# Altium integrated library Samtec_2,54_mm_Pitch_Socket_Strips.IntLib: 489 symbols (part 1 of 4) (continued)
## HLE-113-02-L-DV
designator J?
Cost-Effective Reliable Socket, Surface Mount, Vertical, -55 to 125 degC, 2.54 mm Pitch, 26-Pin, Female, RoHS; Manufacturer: Samtec; PartNumber: HLE-113-02-L-DV; Pitch: 2.54 mm; DatasheetVersion: F-214; PackageVersion: AQ, 12/1998; PackageReference: HLE-113-02-X-DV; PackageDescription: .100 Tiger Beam Socket Assembly; Supplier 1: Newark; Supplier Part Number 1: 84T4125; Orientation: Vertical; RoHS: True; Temperature Range: -55 to 125 degC; Mounting Technology: Surface Mount; ComponentLink1Description: Manufacturer URL; ComponentLink1URL: http://www.samtec.com; ComponentLink2Description: Datasheet; ComponentLink2URL: http://www.samtec.com/documents/webfiles/pdf/HLE.PDF; ComponentLink3Description: Package Specification; ComponentLink3URL: http://www.samtec.com/documents/webfiles/cpdf/HLE-1XX-02-XXX-DV-XX-XX-XX-MKT.pdf
footprint SMTC-HLE-113-02-X-DV (Tiger Beam Socket Assembly, 2x13 Pins, Vertical, 2.54mm Pitch, Female)
pins: 1, 2, 3, 4, 5, 6, 7, 8, 9, 10, 11, 12, 13, 14, 15, 16, 17, 18, 19, 20, 21, 22, 23, 24, 25, 26

## HLE-116-02-F-DV
designator J?
Cost-Effective Reliable Socket, Surface Mount, Vertical, -55 to 125 degC, 2.54 mm Pitch, 32-Pin, Female, RoHS; Manufacturer: Samtec; PartNumber: HLE-116-02-F-DV; Pitch: 2.54 mm; DatasheetVersion: F-214; PackageVersion: AQ, 12/1998; PackageReference: HLE-116-02-X-DV; PackageDescription: .100 Tiger Beam Socket Assembly; Orientation: Vertical; RoHS: True; Temperature Range: -55 to 125 degC; Mounting Technology: Surface Mount; ComponentLink1Description: Manufacturer URL; ComponentLink1URL: http://www.samtec.com; ComponentLink2Description: Datasheet; ComponentLink2URL: http://www.samtec.com/documents/webfiles/pdf/HLE.PDF; ComponentLink3Description: Package Specification; ComponentLink3URL: http://www.samtec.com/documents/webfiles/cpdf/HLE-1XX-02-XXX-DV-XX-XX-XX-MKT.pdf
footprint SMTC-HLE-116-02-X-DV (Tiger Beam Socket Assembly, 2x16 Pins, Vertical, 2.54mm Pitch, Female)
pins: 1, 2, 3, 4, 5, 6, 7, 8, 9, 10, 11, 12, 13, 14, 15, 16, 17, 18, 19, 20, 21, 22, 23, 24, 25, 26, 27, 28, 29, 30, 31, 32

## HLE-116-02-F-DV-A-K
designator J?
Cost-Effective Reliable Socket, Surface Mount, Vertical, -55 to 125 degC, 2.54 mm Pitch, 32-Pin, Female, RoHS; Manufacturer: Samtec; PartNumber: HLE-116-02-F-DV-A-K; Pitch: 2.54 mm; DatasheetVersion: F-214; PackageVersion: AQ, 12/1998; PackageReference: HLE-116-02-X-DV-A-K; PackageDescription: .100 Tiger Beam Socket Assembly; Orientation: Vertical; RoHS: True; Temperature Range: -55 to 125 degC; Mounting Technology: Surface Mount; ComponentLink1Description: Manufacturer URL; ComponentLink1URL: http://www.samtec.com; ComponentLink2Description: Datasheet; ComponentLink2URL: http://www.samtec.com/documents/webfiles/pdf/HLE.PDF; ComponentLink3Description: Package Specification; ComponentLink3URL: http://www.samtec.com/documents/webfiles/cpdf/HLE-1XX-02-XXX-DV-XX-XX-XX-MKT.pdf
footprint SMTC-HLE-116-02-X-DV-A-K (Tiger Beam Socket Assembly, 2x16 Pins, Vertical, 2.54mm Pitch, Female)
pins: 1, 2, 3, 4, 5, 6, 7, 8, 9, 10, 11, 12, 13, 14, 15, 16, 17, 18, 19, 20, 21, 22, 23, 24, 25, 26, 27, 28, 29, 30, 31, 32

## HLE-116-02-L-DV
designator J?
Cost-Effective Reliable Socket, Surface Mount, Vertical, -55 to 125 degC, 2.54 mm Pitch, 32-Pin, Female, RoHS; Manufacturer: Samtec; PartNumber: HLE-116-02-L-DV; Pitch: 2.54 mm; DatasheetVersion: F-214; PackageVersion: AQ, 12/1998; PackageReference: HLE-116-02-X-DV; PackageDescription: .100 Tiger Beam Socket Assembly; Supplier 1: Newark; Supplier Part Number 1: 84T4134; Orientation: Vertical; RoHS: True; Temperature Range: -55 to 125 degC; Mounting Technology: Surface Mount; ComponentLink1Description: Manufacturer URL; ComponentLink1URL: http://www.samtec.com; ComponentLink2Description: Datasheet; ComponentLink2URL: http://www.samtec.com/documents/webfiles/pdf/HLE.PDF; ComponentLink3Description: Package Specification; ComponentLink3URL: http://www.samtec.com/documents/webfiles/cpdf/HLE-1XX-02-XXX-DV-XX-XX-XX-MKT.pdf
footprint SMTC-HLE-116-02-X-DV (Tiger Beam Socket Assembly, 2x16 Pins, Vertical, 2.54mm Pitch, Female)
pins: 1, 2, 3, 4, 5, 6, 7, 8, 9, 10, 11, 12, 13, 14, 15, 16, 17, 18, 19, 20, 21, 22, 23, 24, 25, 26, 27, 28, 29, 30, 31, 32

## HLE-116-02-L-DV-A-K
designator J?
Cost-Effective Reliable Socket, Surface Mount, Vertical, -55 to 125 degC, 2.54 mm Pitch, 32-Pin, Female, RoHS; Manufacturer: Samtec; PartNumber: HLE-116-02-L-DV-A-K; Pitch: 2.54 mm; DatasheetVersion: F-214; PackageVersion: AQ, 12/1998; PackageReference: HLE-116-02-X-DV-A-K; PackageDescription: .100 Tiger Beam Socket Assembly; Orientation: Vertical; RoHS: True; Temperature Range: -55 to 125 degC; Mounting Technology: Surface Mount; ComponentLink1Description: Manufacturer URL; ComponentLink1URL: http://www.samtec.com; ComponentLink2Description: Datasheet; ComponentLink2URL: http://www.samtec.com/documents/webfiles/pdf/HLE.PDF; ComponentLink3Description: Package Specification; ComponentLink3URL: http://www.samtec.com/documents/webfiles/cpdf/HLE-1XX-02-XXX-DV-XX-XX-XX-MKT.pdf
footprint SMTC-HLE-116-02-X-DV-A-K (Tiger Beam Socket Assembly, 2x16 Pins, Vertical, 2.54mm Pitch, Female)
pins: 1, 2, 3, 4, 5, 6, 7, 8, 9, 10, 11, 12, 13, 14, 15, 16, 17, 18, 19, 20, 21, 22, 23, 24, 25, 26, 27, 28, 29, 30, 31, 32

## HLE-120-02-F-DV-BE
designator J?
Cost-Effective Reliable Socket, Surface Mount, Vertical, -55 to 125 degC, 2.54 mm Pitch, 40-Pin, Female, RoHS; Manufacturer: Samtec; PartNumber: HLE-120-02-F-DV-BE; Pitch: 2.54 mm; DatasheetVersion: F-214; PackageVersion: AQ, 12/1998; PackageReference: HLE-120-02-X-DV-BE; PackageDescription: .100 Tiger Beam Socket Assembly; Orientation: Vertical; RoHS: True; Temperature Range: -55 to 125 degC; Mounting Technology: Surface Mount; ComponentLink1Description: Manufacturer URL; ComponentLink1URL: http://www.samtec.com; ComponentLink2Description: Datasheet; ComponentLink2URL: http://www.samtec.com/documents/webfiles/pdf/HLE.PDF; ComponentLink3Description: Package Specification; ComponentLink3URL: http://www.samtec.com/documents/webfiles/cpdf/HLE-1XX-02-XXX-DV-XX-XX-XX-MKT.pdf
footprint SMTC-HLE-120-02-X-DV-BE (Tiger Beam Socket Assembly, 2x20 Pins, Vertical, 2.54mm Pitch, Female)
pins: 1, 2, 3, 4, 5, 6, 7, 8, 9, 10, 11, 12, 13, 14, 15, 16, 17, 18, 19, 20, 21, 22, 23, 24, 25, 26, 27, 28, 29, 30, 31, 32, 33, 34, 35, 36, 37, 38, 39, 40

## HLE-120-02-L-DV-BE
designator J?
Cost-Effective Reliable Socket, Surface Mount, Vertical, -55 to 125 degC, 2.54 mm Pitch, 40-Pin, Female, RoHS; Manufacturer: Samtec; PartNumber: HLE-120-02-L-DV-BE; Pitch: 2.54 mm; DatasheetVersion: F-214; PackageVersion: AQ, 12/1998; PackageReference: HLE-120-02-X-DV-BE; PackageDescription: .100 Tiger Beam Socket Assembly; Orientation: Vertical; RoHS: True; Temperature Range: -55 to 125 degC; Mounting Technology: Surface Mount; ComponentLink1Description: Manufacturer URL; ComponentLink1URL: http://www.samtec.com; ComponentLink2Description: Datasheet; ComponentLink2URL: http://www.samtec.com/documents/webfiles/pdf/HLE.PDF; ComponentLink3Description: Package Specification; ComponentLink3URL: http://www.samtec.com/documents/webfiles/cpdf/HLE-1XX-02-XXX-DV-XX-XX-XX-MKT.pdf
footprint SMTC-HLE-120-02-X-DV-BE (Tiger Beam Socket Assembly, 2x20 Pins, Vertical, 2.54mm Pitch, Female)
pins: 1, 2, 3, 4, 5, 6, 7, 8, 9, 10, 11, 12, 13, 14, 15, 16, 17, 18, 19, 20, 21, 22, 23, 24, 25, 26, 27, 28, 29, 30, 31, 32, 33, 34, 35, 36, 37, 38, 39, 40

## HLE-148-02-F-DV-A-P
designator J?
Cost-Effective Reliable Socket, Surface Mount, Vertical, -55 to 125 degC, 2.54 mm Pitch, 96-Pin, Female, RoHS; Manufacturer: Samtec; PartNumber: HLE-148-02-F-DV-A-P; Pitch: 2.54 mm; DatasheetVersion: F-214; PackageVersion: AQ, 12/1998; PackageReference: HLE-148-02-X-DV-A-P; PackageDescription: .100 Tiger Beam Socket Assembly; Orientation: Vertical; RoHS: True; Temperature Range: -55 to 125 degC; Mounting Technology: Surface Mount; ComponentLink1Description: Manufacturer URL; ComponentLink1URL: http://www.samtec.com; ComponentLink2Description: Datasheet; ComponentLink2URL: http://www.samtec.com/documents/webfiles/pdf/HLE.PDF; ComponentLink3Description: Package Specification; ComponentLink3URL: http://www.samtec.com/documents/webfiles/cpdf/HLE-1XX-02-XXX-DV-XX-XX-XX-MKT.pdf
footprint SMTC-HLE-148-02-X-DV-A-P (Tiger Beam Socket Assembly, 2x48 Pins, Vertical, 2.54mm Pitch, Female)
pins: 1, 2, 3, 4, 5, 6, 7, 8, 9, 10, 11, 12, 13, 14, 15, 16, 17, 18, 19, 20, 21, 22, 23, 24, 25, 26, 27, 28, 29, 30, 31, 32, 33, 34, 35, 36, 37, 38, 39, 40, 41, 42, 43, 44, 45, 46, 47, 48, 49, 50, 51, 52, 53, 54, 55, 56, 57, 58, 59, 60, 61, 62, 63, 64, 65, 66, 67, 68, 69, 70, 71, 72, 73, 74, 75, 76, 77, 78, 79, 80, 81, 82, 83, 84, 85, 86, 87, 88, 89, 90, 91, 92, 93, 94, 95, 96

## HLE-148-02-L-DV-A-P
designator J?
Cost-Effective Reliable Socket, Surface Mount, Vertical, -55 to 125 degC, 2.54 mm Pitch, 96-Pin, Female, RoHS; Manufacturer: Samtec; PartNumber: HLE-148-02-L-DV-A-P; Pitch: 2.54 mm; DatasheetVersion: F-214; PackageVersion: AQ, 12/1998; PackageReference: HLE-148-02-X-DV-A-P; PackageDescription: .100 Tiger Beam Socket Assembly; Orientation: Vertical; RoHS: True; Temperature Range: -55 to 125 degC; Mounting Technology: Surface Mount; ComponentLink1Description: Manufacturer URL; ComponentLink1URL: http://www.samtec.com; ComponentLink2Description: Datasheet; ComponentLink2URL: http://www.samtec.com/documents/webfiles/pdf/HLE.PDF; ComponentLink3Description: Package Specification; ComponentLink3URL: http://www.samtec.com/documents/webfiles/cpdf/HLE-1XX-02-XXX-DV-XX-XX-XX-MKT.pdf
footprint SMTC-HLE-148-02-X-DV-A-P (Tiger Beam Socket Assembly, 2x48 Pins, Vertical, 2.54mm Pitch, Female)
pins: 1, 2, 3, 4, 5, 6, 7, 8, 9, 10, 11, 12, 13, 14, 15, 16, 17, 18, 19, 20, 21, 22, 23, 24, 25, 26, 27, 28, 29, 30, 31, 32, 33, 34, 35, 36, 37, 38, 39, 40, 41, 42, 43, 44, 45, 46, 47, 48, 49, 50, 51, 52, 53, 54, 55, 56, 57, 58, 59, 60, 61, 62, 63, 64, 65, 66, 67, 68, 69, 70, 71, 72, 73, 74, 75, 76, 77, 78, 79, 80, 81, 82, 83, 84, 85, 86, 87, 88, 89, 90, 91, 92, 93, 94, 95, 96

## PHF-102-01-L-S-002
designator J?
Press Fit Socket, Through-hole, Vertical, -55 to 125 degC, 2.54 mm Pitch, 2-Pin, Female, RoHS; Manufacturer: Samtec; PartNumber: PHF-102-01-L-S-002; Pitch: 2.54 mm; DatasheetVersion: F-214; PackageVersion: F, 9/2009; PackageReference: PHF-102-01-X-S-002; PackageDescription: .100 Press Fit Socket Assembly; Orientation: Vertical; RoHS: True; Temperature Range: -55 to 125 degC; Mounting Technology: Through-hole; ComponentLink1Description: Manufacturer URL; ComponentLink1URL: http://www.samtec.com; ComponentLink2Description: Datasheet; ComponentLink2URL: http://www.samtec.com/documents/webfiles/pdf/phf.pdf; ComponentLink3Description: Package Specification; ComponentLink3URL: http://www.samtec.com/documents/webfiles/cpdf/PHF-1XX-XX-X-X-XXX-MKT.pdf
footprint SMTC-PHF-102-01-X-S-002 (Press Fit Socket Assembly, 1x2 Pins, Vertical, 2.54mm Pitch, Female)
pins: 1, 2

## PHF-102-01-L-S-02
designator J?
Press Fit Socket, Through-hole, Vertical, -55 to 125 degC, 2.54 mm Pitch, 2-Pin, Female, RoHS; Manufacturer: Samtec; PartNumber: PHF-102-01-L-S-02; Pitch: 2.54 mm; DatasheetVersion: F-214; PackageVersion: F, 9/2009; PackageReference: PHF-102-01-X-S-02; PackageDescription: .100 Press Fit Socket Assembly; Orientation: Vertical; RoHS: True; Temperature Range: -55 to 125 degC; Mounting Technology: Through-hole; ComponentLink1Description: Manufacturer URL; ComponentLink1URL: http://www.samtec.com; ComponentLink2Description: Datasheet; ComponentLink2URL: http://www.samtec.com/documents/webfiles/pdf/phf.pdf; ComponentLink3Description: Package Specification; ComponentLink3URL: http://www.samtec.com/documents/webfiles/cpdf/PHF-1XX-XX-X-X-XXX-MKT.pdf
footprint SMTC-PHF-102-01-X-S-02 (Press Fit Socket Assembly, 1x2 Pins, Vertical, 2.54mm Pitch, Female)
pins: 1, 2

## PHF-102-03-L-S
designator J?
Press Fit Socket, Through-hole, Vertical, -55 to 125 degC, 2.54 mm Pitch, 2-Pin, Female, RoHS; Manufacturer: Samtec; PartNumber: PHF-102-03-L-S; Pitch: 2.54 mm; DatasheetVersion: F-214; PackageVersion: F, 9/2009; PackageReference: PHF-102-03-X-S; PackageDescription: .100 Press Fit Socket Assembly; Orientation: Vertical; RoHS: True; Temperature Range: -55 to 125 degC; Mounting Technology: Through-hole; ComponentLink1Description: Manufacturer URL; ComponentLink1URL: http://www.samtec.com; ComponentLink2Description: Datasheet; ComponentLink2URL: http://www.samtec.com/documents/webfiles/pdf/phf.pdf; ComponentLink3Description: Package Specification; ComponentLink3URL: http://www.samtec.com/documents/webfiles/cpdf/PHF-1XX-XX-X-X-XXX-MKT.pdf
footprint SMTC-PHF-102-03-X-S (Press Fit Socket Assembly, 1x2 Pins, Vertical, 2.54mm Pitch, Female)
pins: 1, 2

## PHF-102-04-L-S
designator J?
Press Fit Socket, Through-hole, Vertical, -55 to 125 degC, 2.54 mm Pitch, 2-Pin, Female, RoHS; Manufacturer: Samtec; PartNumber: PHF-102-04-L-S; Pitch: 2.54 mm; DatasheetVersion: F-214; PackageVersion: F, 9/2009; PackageReference: PHF-102-04-X-S; PackageDescription: .100 Press Fit Socket Assembly; Orientation: Vertical; RoHS: True; Temperature Range: -55 to 125 degC; Mounting Technology: Through-hole; ComponentLink1Description: Manufacturer URL; ComponentLink1URL: http://www.samtec.com; ComponentLink2Description: Datasheet; ComponentLink2URL: http://www.samtec.com/documents/webfiles/pdf/phf.pdf; ComponentLink3Description: Package Specification; ComponentLink3URL: http://www.samtec.com/documents/webfiles/cpdf/PHF-1XX-XX-X-X-XXX-MKT.pdf
footprint SMTC-PHF-102-04-X-S (Press Fit Socket Assembly, 1x2 Pins, Vertical, 2.54mm Pitch, Female)
pins: 1, 2

## PHF-103-01-L-S-001
designator J?
Press Fit Socket, Through-hole, Vertical, -55 to 125 degC, 2.54 mm Pitch, 3-Pin, Female, RoHS; Manufacturer: Samtec; PartNumber: PHF-103-01-L-S-001; Pitch: 2.54 mm; DatasheetVersion: F-214; PackageVersion: F, 9/2009; PackageReference: PHF-103-01-X-S-001; PackageDescription: .100 Press Fit Socket Assembly; Orientation: Vertical; RoHS: True; Temperature Range: -55 to 125 degC; Mounting Technology: Through-hole; ComponentLink1Description: Manufacturer URL; ComponentLink1URL: http://www.samtec.com; ComponentLink2Description: Datasheet; ComponentLink2URL: http://www.samtec.com/documents/webfiles/pdf/phf.pdf; ComponentLink3Description: Package Specification; ComponentLink3URL: http://www.samtec.com/documents/webfiles/cpdf/PHF-1XX-XX-X-X-XXX-MKT.pdf
footprint SMTC-PHF-103-01-X-S-001 (Press Fit Socket Assembly, 1x3 Pins, Vertical, 2.54mm Pitch, Female)
pins: 1, 2, 3

## PHF-103-01-L-S-002
designator J?
Press Fit Socket, Through-hole, Vertical, -55 to 125 degC, 2.54 mm Pitch, 3-Pin, Female, RoHS; Manufacturer: Samtec; PartNumber: PHF-103-01-L-S-002; Pitch: 2.54 mm; DatasheetVersion: F-214; PackageVersion: F, 9/2009; PackageReference: PHF-103-01-X-S-002; PackageDescription: .100 Press Fit Socket Assembly; Orientation: Vertical; RoHS: True; Temperature Range: -55 to 125 degC; Mounting Technology: Through-hole; ComponentLink1Description: Manufacturer URL; ComponentLink1URL: http://www.samtec.com; ComponentLink2Description: Datasheet; ComponentLink2URL: http://www.samtec.com/documents/webfiles/pdf/phf.pdf; ComponentLink3Description: Package Specification; ComponentLink3URL: http://www.samtec.com/documents/webfiles/cpdf/PHF-1XX-XX-X-X-XXX-MKT.pdf
footprint SMTC-PHF-103-01-X-S-002 (Press Fit Socket Assembly, 1x3 Pins, Vertical, 2.54mm Pitch, Female)
pins: 1, 2, 3

## PHF-105-01-L-D
designator J?
Press Fit Socket, Through-hole, Vertical, -55 to 125 degC, 2.54 mm Pitch, 10-Pin, Female, RoHS; Manufacturer: Samtec; PartNumber: PHF-105-01-L-D; Pitch: 2.54 mm; DatasheetVersion: F-214; PackageVersion: F, 9/2009; PackageReference: PHF-105-01-X-D; PackageDescription: .100 Press Fit Socket Assembly; Orientation: Vertical; RoHS: True; Temperature Range: -55 to 125 degC; Mounting Technology: Through-hole; ComponentLink1Description: Manufacturer URL; ComponentLink1URL: http://www.samtec.com; ComponentLink2Description: Datasheet; ComponentLink2URL: http://www.samtec.com/documents/webfiles/pdf/phf.pdf; ComponentLink3Description: Package Specification; ComponentLink3URL: http://www.samtec.com/documents/webfiles/cpdf/PHF-1XX-XX-X-X-XXX-MKT.pdf
footprint SMTC-PHF-105-01-X-D (Press Fit Socket Assembly, 2x5 Pins, Vertical, 2.54mm Pitch, Female)
pins: 1, 2, 3, 4, 5, 6, 7, 8, 9, 10

## PHF-105-01-L-S
designator J?
Press Fit Socket, Through-hole, Vertical, -55 to 125 degC, 2.54 mm Pitch, 5-Pin, Female, RoHS; Manufacturer: Samtec; PartNumber: PHF-105-01-L-S; Pitch: 2.54 mm; DatasheetVersion: F-214; PackageVersion: F, 9/2009; PackageReference: PHF-105-01-X-S; PackageDescription: .100 Press Fit Socket Assembly; Orientation: Vertical; RoHS: True; Temperature Range: -55 to 125 degC; Mounting Technology: Through-hole; ComponentLink1Description: Manufacturer URL; ComponentLink1URL: http://www.samtec.com; ComponentLink2Description: Datasheet; ComponentLink2URL: http://www.samtec.com/documents/webfiles/pdf/phf.pdf; ComponentLink3Description: Package Specification; ComponentLink3URL: http://www.samtec.com/documents/webfiles/cpdf/PHF-1XX-XX-X-X-XXX-MKT.pdf
footprint SMTC-PHF-105-01-X-S (Press Fit Socket Assembly, 1x5 Pins, Vertical, 2.54mm Pitch, Female)
pins: 1, 2, 3, 4, 5

## PHF-105-02-L-D
designator J?
Press Fit Socket, Through-hole, Vertical, -55 to 125 degC, 2.54 mm Pitch, 10-Pin, Female, RoHS; Manufacturer: Samtec; PartNumber: PHF-105-02-L-D; Pitch: 2.54 mm; DatasheetVersion: F-214; PackageVersion: F, 9/2009; PackageReference: PHF-105-02-X-D; PackageDescription: .100 Press Fit Socket Assembly; Orientation: Vertical; RoHS: True; Temperature Range: -55 to 125 degC; Mounting Technology: Through-hole; ComponentLink1Description: Manufacturer URL; ComponentLink1URL: http://www.samtec.com; ComponentLink2Description: Datasheet; ComponentLink2URL: http://www.samtec.com/documents/webfiles/pdf/phf.pdf; ComponentLink3Description: Package Specification; ComponentLink3URL: http://www.samtec.com/documents/webfiles/cpdf/PHF-1XX-XX-X-X-XXX-MKT.pdf
footprint SMTC-PHF-105-02-X-D (Press Fit Socket Assembly, 2x5 Pins, Vertical, 2.54mm Pitch, Female)
pins: 1, 2, 3, 4, 5, 6, 7, 8, 9, 10

## PHF-105-04-L-S
designator J?
Press Fit Socket, Through-hole, Vertical, -55 to 125 degC, 2.54 mm Pitch, 5-Pin, Female, RoHS; Manufacturer: Samtec; PartNumber: PHF-105-04-L-S; Pitch: 2.54 mm; DatasheetVersion: F-214; PackageVersion: F, 9/2009; PackageReference: PHF-105-04-X-S; PackageDescription: .100 Press Fit Socket Assembly; Supplier 1: Newark; Supplier Part Number 1: 28X4866; Orientation: Vertical; RoHS: True; Temperature Range: -55 to 125 degC; Mounting Technology: Through-hole; ComponentLink1Description: Manufacturer URL; ComponentLink1URL: http://www.samtec.com; ComponentLink2Description: Datasheet; ComponentLink2URL: http://www.samtec.com/documents/webfiles/pdf/phf.pdf; ComponentLink3Description: Package Specification; ComponentLink3URL: http://www.samtec.com/documents/webfiles/cpdf/PHF-1XX-XX-X-X-XXX-MKT.pdf
footprint SMTC-PHF-105-04-X-S (Press Fit Socket Assembly, 1x5 Pins, Vertical, 2.54mm Pitch, Female)
pins: 1, 2, 3, 4, 5

## PHF-108-01-L-D
designator J?
Press Fit Socket, Through-hole, Vertical, -55 to 125 degC, 2.54 mm Pitch, 16-Pin, Female, RoHS; Manufacturer: Samtec; PartNumber: PHF-108-01-L-D; Pitch: 2.54 mm; DatasheetVersion: F-214; PackageVersion: F, 9/2009; PackageReference: PHF-108-01-X-D; PackageDescription: .100 Press Fit Socket Assembly; Orientation: Vertical; RoHS: True; Temperature Range: -55 to 125 degC; Mounting Technology: Through-hole; ComponentLink1Description: Manufacturer URL; ComponentLink1URL: http://www.samtec.com; ComponentLink2Description: Datasheet; ComponentLink2URL: http://www.samtec.com/documents/webfiles/pdf/phf.pdf; ComponentLink3Description: Package Specification; ComponentLink3URL: http://www.samtec.com/documents/webfiles/cpdf/PHF-1XX-XX-X-X-XXX-MKT.pdf
footprint SMTC-PHF-108-01-X-D (Press Fit Socket Assembly, 2x8 Pins, Vertical, 2.54mm Pitch, Female)
pins: 1, 2, 3, 4, 5, 6, 7, 8, 9, 10, 11, 12, 13, 14, 15, 16

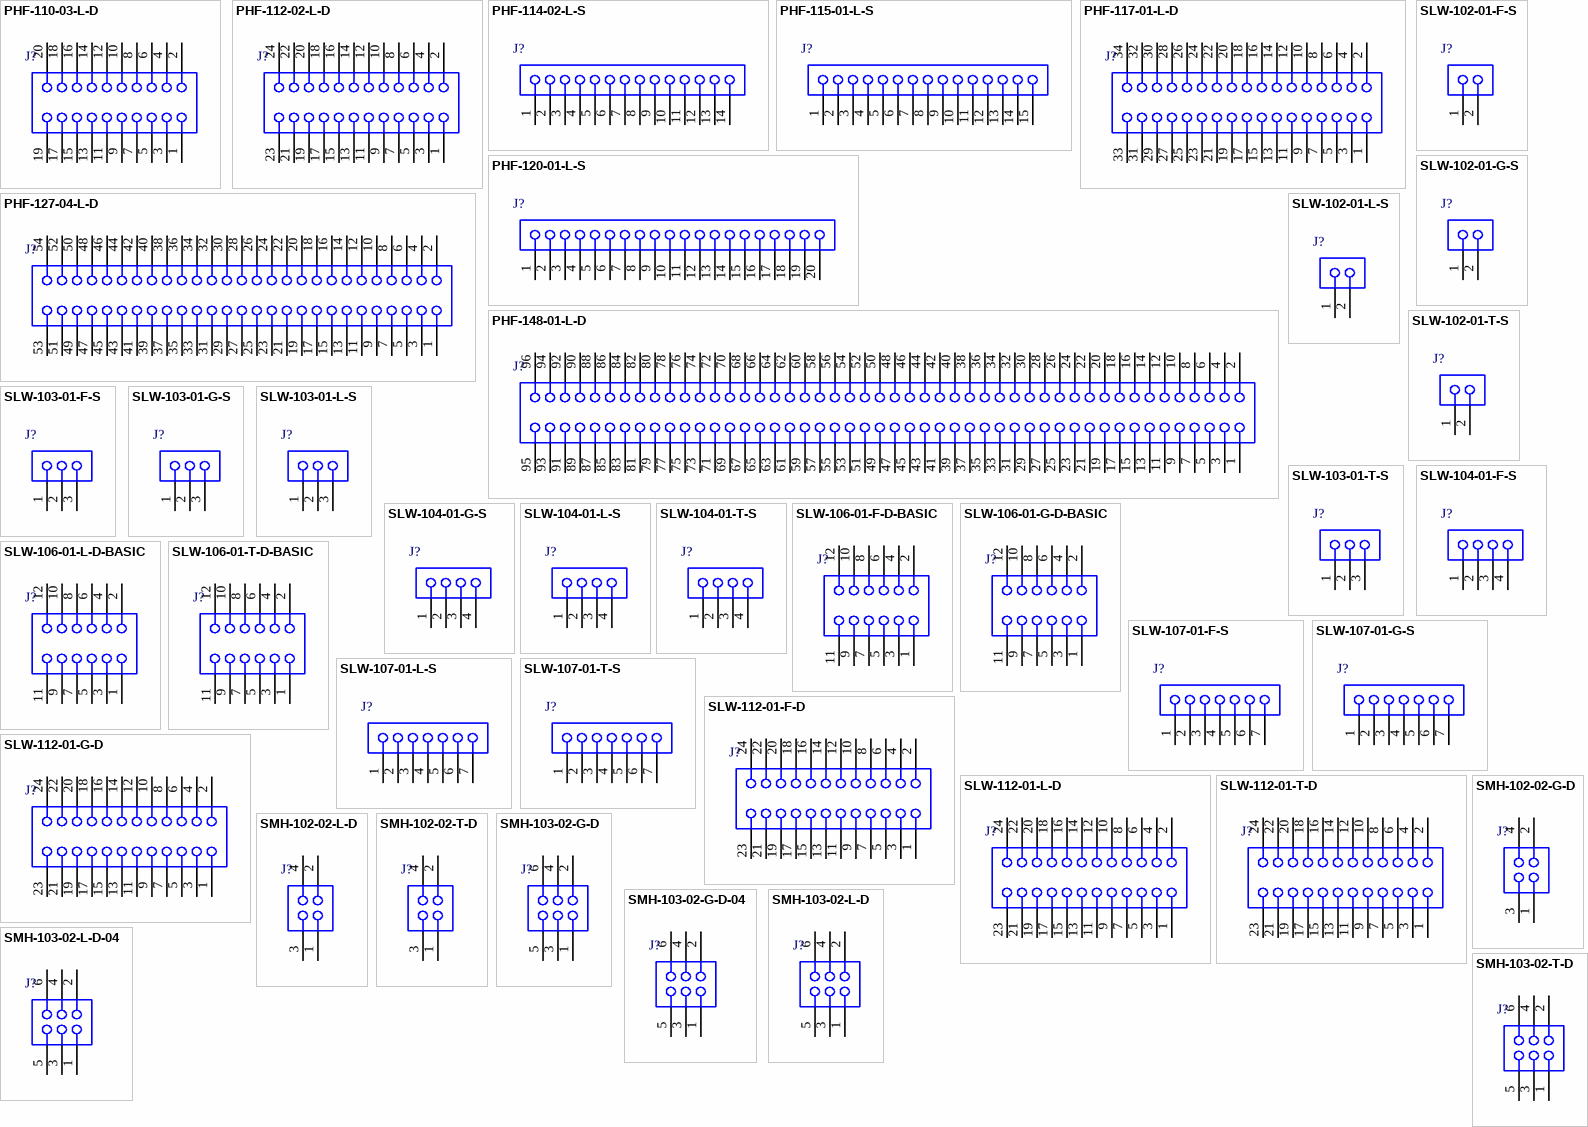
[diagram p3: symbols PHF-110-03-L-D to SMH-103-02-T-D]

## PHF-110-03-L-D
designator J?
Press Fit Socket, Through-hole, Vertical, -55 to 125 degC, 2.54 mm Pitch, 20-Pin, Female, RoHS; Manufacturer: Samtec; PartNumber: PHF-110-03-L-D; Pitch: 2.54 mm; DatasheetVersion: F-214; PackageVersion: F, 9/2009; PackageReference: PHF-110-03-X-D; PackageDescription: .100 Press Fit Socket Assembly; Orientation: Vertical; RoHS: True; Temperature Range: -55 to 125 degC; Mounting Technology: Through-hole; ComponentLink1Description: Manufacturer URL; ComponentLink1URL: http://www.samtec.com; ComponentLink2Description: Datasheet; ComponentLink2URL: http://www.samtec.com/documents/webfiles/pdf/phf.pdf; ComponentLink3Description: Package Specification; ComponentLink3URL: http://www.samtec.com/documents/webfiles/cpdf/PHF-1XX-XX-X-X-XXX-MKT.pdf
footprint SMTC-PHF-110-03-X-D (Press Fit Socket Assembly, 2x10 Pins, Vertical, 2.54mm Pitch, Female)
pins: 1, 2, 3, 4, 5, 6, 7, 8, 9, 10, 11, 12, 13, 14, 15, 16, 17, 18, 19, 20

## PHF-112-02-L-D
designator J?
Press Fit Socket, Through-hole, Vertical, -55 to 125 degC, 2.54 mm Pitch, 24-Pin, Female, RoHS; Manufacturer: Samtec; PartNumber: PHF-112-02-L-D; Pitch: 2.54 mm; DatasheetVersion: F-214; PackageVersion: F, 9/2009; PackageReference: PHF-112-02-X-D; PackageDescription: .100 Press Fit Socket Assembly; Orientation: Vertical; RoHS: True; Temperature Range: -55 to 125 degC; Mounting Technology: Through-hole; ComponentLink1Description: Manufacturer URL; ComponentLink1URL: http://www.samtec.com; ComponentLink2Description: Datasheet; ComponentLink2URL: http://www.samtec.com/documents/webfiles/pdf/phf.pdf; ComponentLink3Description: Package Specification; ComponentLink3URL: http://www.samtec.com/documents/webfiles/cpdf/PHF-1XX-XX-X-X-XXX-MKT.pdf
footprint SMTC-PHF-112-02-X-D (Press Fit Socket Assembly, 2x12 Pins, Vertical, 2.54mm Pitch, Female)
pins: 1, 2, 3, 4, 5, 6, 7, 8, 9, 10, 11, 12, 13, 14, 15, 16, 17, 18, 19, 20, 21, 22, 23, 24

## PHF-114-02-L-S
designator J?
Press Fit Socket, Through-hole, Vertical, -55 to 125 degC, 2.54 mm Pitch, 14-Pin, Female, RoHS; Manufacturer: Samtec; PartNumber: PHF-114-02-L-S; Pitch: 2.54 mm; DatasheetVersion: F-214; PackageVersion: F, 9/2009; PackageReference: PHF-114-02-X-S; PackageDescription: .100 Press Fit Socket Assembly; Orientation: Vertical; RoHS: True; Temperature Range: -55 to 125 degC; Mounting Technology: Through-hole; ComponentLink1Description: Manufacturer URL; ComponentLink1URL: http://www.samtec.com; ComponentLink2Description: Datasheet; ComponentLink2URL: http://www.samtec.com/documents/webfiles/pdf/phf.pdf; ComponentLink3Description: Package Specification; ComponentLink3URL: http://www.samtec.com/documents/webfiles/cpdf/PHF-1XX-XX-X-X-XXX-MKT.pdf
footprint SMTC-PHF-114-02-X-S (Press Fit Socket Assembly, 1x14 Pins, Vertical, 2.54mm Pitch, Female)
pins: 1, 2, 3, 4, 5, 6, 7, 8, 9, 10, 11, 12, 13, 14

## PHF-115-01-L-S
designator J?
Press Fit Socket, Through-hole, Vertical, -55 to 125 degC, 2.54 mm Pitch, 15-Pin, Female, RoHS; Manufacturer: Samtec; PartNumber: PHF-115-01-L-S; Pitch: 2.54 mm; DatasheetVersion: F-214; PackageVersion: F, 9/2009; PackageReference: PHF-115-01-X-S; PackageDescription: .100 Press Fit Socket Assembly; Orientation: Vertical; RoHS: True; Temperature Range: -55 to 125 degC; Mounting Technology: Through-hole; ComponentLink1Description: Manufacturer URL; ComponentLink1URL: http://www.samtec.com; ComponentLink2Description: Datasheet; ComponentLink2URL: http://www.samtec.com/documents/webfiles/pdf/phf.pdf; ComponentLink3Description: Package Specification; ComponentLink3URL: http://www.samtec.com/documents/webfiles/cpdf/PHF-1XX-XX-X-X-XXX-MKT.pdf
footprint SMTC-PHF-115-01-X-S (Press Fit Socket Assembly, 1x15 Pins, Vertical, 2.54mm Pitch, Female)
pins: 1, 2, 3, 4, 5, 6, 7, 8, 9, 10, 11, 12, 13, 14, 15

## PHF-117-01-L-D
designator J?
Press Fit Socket, Through-hole, Vertical, -55 to 125 degC, 2.54 mm Pitch, 34-Pin, Female, RoHS; Manufacturer: Samtec; PartNumber: PHF-117-01-L-D; Pitch: 2.54 mm; DatasheetVersion: F-214; PackageVersion: F, 9/2009; PackageReference: PHF-117-01-X-D; PackageDescription: .100 Press Fit Socket Assembly; Orientation: Vertical; RoHS: True; Temperature Range: -55 to 125 degC; Mounting Technology: Through-hole; ComponentLink1Description: Manufacturer URL; ComponentLink1URL: http://www.samtec.com; ComponentLink2Description: Datasheet; ComponentLink2URL: http://www.samtec.com/documents/webfiles/pdf/phf.pdf; ComponentLink3Description: Package Specification; ComponentLink3URL: http://www.samtec.com/documents/webfiles/cpdf/PHF-1XX-XX-X-X-XXX-MKT.pdf
footprint SMTC-PHF-117-01-X-D (Press Fit Socket Assembly, 2x17 Pins, Vertical, 2.54mm Pitch, Female)
pins: 1, 2, 3, 4, 5, 6, 7, 8, 9, 10, 11, 12, 13, 14, 15, 16, 17, 18, 19, 20, 21, 22, 23, 24, 25, 26, 27, 28, 29, 30, 31, 32, 33, 34

## PHF-120-01-L-S
designator J?
Press Fit Socket, Through-hole, Vertical, -55 to 125 degC, 2.54 mm Pitch, 20-Pin, Female, RoHS; Manufacturer: Samtec; PartNumber: PHF-120-01-L-S; Pitch: 2.54 mm; DatasheetVersion: F-214; PackageVersion: F, 9/2009; PackageReference: PHF-120-01-X-S; PackageDescription: .100 Press Fit Socket Assembly; Orientation: Vertical; RoHS: True; Temperature Range: -55 to 125 degC; Mounting Technology: Through-hole; ComponentLink1Description: Manufacturer URL; ComponentLink1URL: http://www.samtec.com; ComponentLink2Description: Datasheet; ComponentLink2URL: http://www.samtec.com/documents/webfiles/pdf/phf.pdf; ComponentLink3Description: Package Specification; ComponentLink3URL: http://www.samtec.com/documents/webfiles/cpdf/PHF-1XX-XX-X-X-XXX-MKT.pdf
footprint SMTC-PHF-120-01-X-S (Press Fit Socket Assembly, 1x20 Pins, Vertical, 2.54mm Pitch, Female)
pins: 1, 2, 3, 4, 5, 6, 7, 8, 9, 10, 11, 12, 13, 14, 15, 16, 17, 18, 19, 20

## PHF-127-04-L-D
designator J?
Press Fit Socket, Through-hole, Vertical, -55 to 125 degC, 2.54 mm Pitch, 54-Pin, Female, RoHS; Manufacturer: Samtec; PartNumber: PHF-127-04-L-D; Pitch: 2.54 mm; DatasheetVersion: F-214; PackageVersion: F, 9/2009; PackageReference: PHF-127-04-X-D; PackageDescription: .100 Press Fit Socket Assembly; Orientation: Vertical; RoHS: True; Temperature Range: -55 to 125 degC; Mounting Technology: Through-hole; ComponentLink1Description: Manufacturer URL; ComponentLink1URL: http://www.samtec.com; ComponentLink2Description: Datasheet; ComponentLink2URL: http://www.samtec.com/documents/webfiles/pdf/phf.pdf; ComponentLink3Description: Package Specification; ComponentLink3URL: http://www.samtec.com/documents/webfiles/cpdf/PHF-1XX-XX-X-X-XXX-MKT.pdf
footprint SMTC-PHF-127-04-X-D (Press Fit Socket Assembly, 2x27 Pins, Vertical, 2.54mm Pitch, Female)
pins: 1, 2, 3, 4, 5, 6, 7, 8, 9, 10, 11, 12, 13, 14, 15, 16, 17, 18, 19, 20, 21, 22, 23, 24, 25, 26, 27, 28, 29, 30, 31, 32, 33, 34, 35, 36, 37, 38, 39, 40, 41, 42, 43, 44, 45, 46, 47, 48, 49, 50, 51, 52, 53, 54

## PHF-148-01-L-D
designator J?
Press Fit Socket, Through-hole, Vertical, -55 to 125 degC, 2.54 mm Pitch, 96-Pin, Female, RoHS; Manufacturer: Samtec; PartNumber: PHF-148-01-L-D; Pitch: 2.54 mm; DatasheetVersion: F-214; PackageVersion: F, 9/2009; PackageReference: PHF-148-01-X-D; PackageDescription: .100 Press Fit Socket Assembly; Orientation: Vertical; RoHS: True; Temperature Range: -55 to 125 degC; Mounting Technology: Through-hole; ComponentLink1Description: Manufacturer URL; ComponentLink1URL: http://www.samtec.com; ComponentLink2Description: Datasheet; ComponentLink2URL: http://www.samtec.com/documents/webfiles/pdf/phf.pdf; ComponentLink3Description: Package Specification; ComponentLink3URL: http://www.samtec.com/documents/webfiles/cpdf/PHF-1XX-XX-X-X-XXX-MKT.pdf
footprint SMTC-PHF-148-01-X-D (Press Fit Socket Assembly, 2x48 Pins, Vertical, 2.54mm Pitch, Female)
pins: 1, 2, 3, 4, 5, 6, 7, 8, 9, 10, 11, 12, 13, 14, 15, 16, 17, 18, 19, 20, 21, 22, 23, 24, 25, 26, 27, 28, 29, 30, 31, 32, 33, 34, 35, 36, 37, 38, 39, 40, 41, 42, 43, 44, 45, 46, 47, 48, 49, 50, 51, 52, 53, 54, 55, 56, 57, 58, 59, 60, 61, 62, 63, 64, 65, 66, 67, 68, 69, 70, 71, 72, 73, 74, 75, 76, 77, 78, 79, 80, 81, 82, 83, 84, 85, 86, 87, 88, 89, 90, 91, 92, 93, 94, 95, 96

## SLW-102-01-F-S
designator J?
Low Profile Socket Strips, Through-hole, Vertical, -55 to 125 degC, 2.54 mm Pitch, 2-Pin, Female, RoHS; Manufacturer: Samtec; PartNumber: SLW-102-01-F-S; Pitch: 2.54 mm; DatasheetVersion: F-214; PackageVersion: X, 9/1987; PackageReference: SLW-102-01-X-S; PackageDescription: Low Profile Socket Strip; Orientation: Vertical; RoHS: True; Temperature Range: -55 to 125 degC; Mounting Technology: Through-hole; ComponentLink1Description: Manufacturer URL; ComponentLink1URL: http://www.samtec.com; ComponentLink2Description: Datasheet; ComponentLink2URL: http://www.samtec.com/documents/webfiles/pdf/SLW.PDF; ComponentLink3Description: Package Specification; ComponentLink3URL: http://www.samtec.com/documents/webfiles/cpdf/SLW-1XX-01-X-X-MKT.pdf
footprint SMTC-SLW-102-01-X-S (Low Profile Socket Strip, 1x2 Pins, Vertical, 2.54mm Pitch, Female)
pins: 1, 2

## SLW-102-01-G-S
designator J?
Low Profile Socket Strips, Through-hole, Vertical, -55 to 125 degC, 2.54 mm Pitch, 2-Pin, Female, RoHS; Manufacturer: Samtec; PartNumber: SLW-102-01-G-S; Pitch: 2.54 mm; DatasheetVersion: F-214; PackageVersion: X, 9/1987; PackageReference: SLW-102-01-X-S; PackageDescription: Low Profile Socket Strip; Supplier 1: Digi-Key; Supplier Part Number 1: SAM1089-02-ND; Supplier 2: Farnell; Supplier Part Number 2: 1668093; Supplier 3: Newark; Supplier Part Number 3: 11P6845; Orientation: Vertical; RoHS: True; Temperature Range: -55 to 125 degC; Mounting Technology: Through-hole; ComponentLink1Description: Manufacturer URL; ComponentLink1URL: http://www.samtec.com; ComponentLink2Description: Datasheet; ComponentLink2URL: http://www.samtec.com/documents/webfiles/pdf/SLW.PDF; ComponentLink3Description: Package Specification; ComponentLink3URL: http://www.samtec.com/documents/webfiles/cpdf/SLW-1XX-01-X-X-MKT.pdf
footprint SMTC-SLW-102-01-X-S (Low Profile Socket Strip, 1x2 Pins, Vertical, 2.54mm Pitch, Female)
pins: 1, 2

## SLW-102-01-L-S
designator J?
Low Profile Socket Strips, Through-hole, Vertical, -55 to 125 degC, 2.54 mm Pitch, 2-Pin, Female, RoHS; Manufacturer: Samtec; PartNumber: SLW-102-01-L-S; Pitch: 2.54 mm; DatasheetVersion: F-214; PackageVersion: X, 9/1987; PackageReference: SLW-102-01-X-S; PackageDescription: Low Profile Socket Strip; Orientation: Vertical; RoHS: True; Temperature Range: -55 to 125 degC; Mounting Technology: Through-hole; ComponentLink1Description: Manufacturer URL; ComponentLink1URL: http://www.samtec.com; ComponentLink2Description: Datasheet; ComponentLink2URL: http://www.samtec.com/documents/webfiles/pdf/SLW.PDF; ComponentLink3Description: Package Specification; ComponentLink3URL: http://www.samtec.com/documents/webfiles/cpdf/SLW-1XX-01-X-X-MKT.pdf
footprint SMTC-SLW-102-01-X-S (Low Profile Socket Strip, 1x2 Pins, Vertical, 2.54mm Pitch, Female)
pins: 1, 2

## SLW-102-01-T-S
designator J?
Low Profile Socket Strips, Through-hole, Vertical, -55 to 105 degC, 2.54 mm Pitch, 2-Pin, Female, RoHS; Manufacturer: Samtec; PartNumber: SLW-102-01-T-S; Pitch: 2.54 mm; DatasheetVersion: F-214; PackageVersion: X, 9/1987; PackageReference: SLW-102-01-X-S; PackageDescription: Low Profile Socket Strip; Supplier 1: Digi-Key; Supplier Part Number 1: SAM1093-02-ND; Supplier 2: Newark; Supplier Part Number 2: 11P6849; Orientation: Vertical; RoHS: True; Temperature Range: -55 to 105 degC; Mounting Technology: Through-hole; ComponentLink1Description: Manufacturer URL; ComponentLink1URL: http://www.samtec.com; ComponentLink2Description: Datasheet; ComponentLink2URL: http://www.samtec.com/documents/webfiles/pdf/SLW.PDF; ComponentLink3Description: Package Specification; ComponentLink3URL: http://www.samtec.com/documents/webfiles/cpdf/SLW-1XX-01-X-X-MKT.pdf
footprint SMTC-SLW-102-01-X-S (Low Profile Socket Strip, 1x2 Pins, Vertical, 2.54mm Pitch, Female)
pins: 1, 2